# Altium footprint library hphonglib.PcbLib: 1250 footprints (part 23 of 79)
Each footprint in its own frame and in the unit in brackets; x right, y up, seen from the top. Pads: shape width x height; smd on the part's side, far side on the other; paste and mask are expansions set on the pad; w line width, h text height; cw(c..) or ccw(c..) is an arc to the next point about the centre after c.
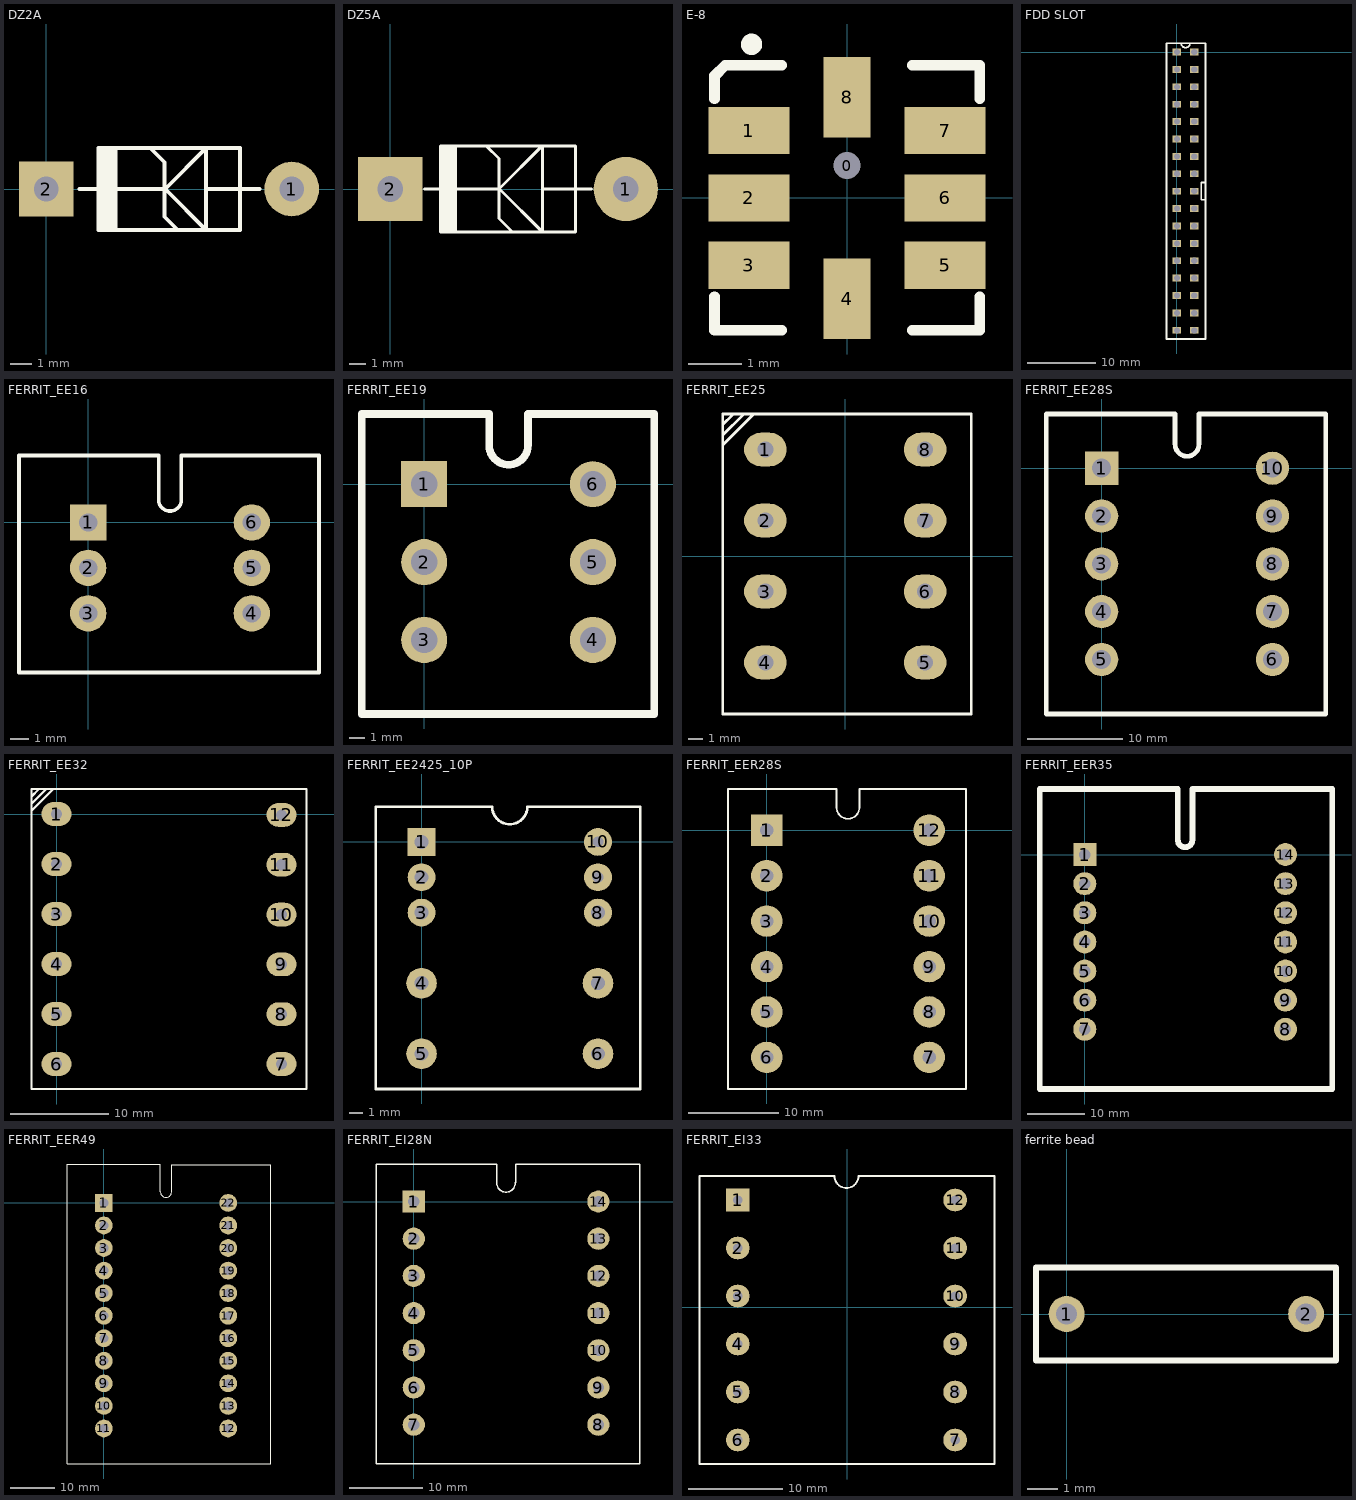
[diagram p22: the footprints below, top view; thin cyan lines are the x and y axes]

## DZ2A [mil] "Diode 2A, W 150mil, L 450mil"
height 100
pads (2):
  round 100 hole 45: 1(450,0)
  rect 100x100 hole 45: 2(0,0)
Top Overlay:
  region: 95,75 95,-75 130,-75 130,75
  lines w7: 61,0 96,0 ; 96,-31 96,0 ; 96,32 96,0 ; 115,0 215,0 ; 194,72 217,49 217,-51 239,-73 ; 218,1 218,0 ; 295,0 360,0 ; 355,0 391,0 ; 218,0 293,-75 293,75 218,0 ; 96,-75 355,-75 355,75 96,75 96,-75
3D body "SW3DPS-DIODE0_4-DEFAULT.STEP": height 100.5, standoff -100, extent -5,-46 425,55

## DZ5A [mil] "Diode 5A, W 200mil, L 550mil"
height 150
pads (2):
  round 150 hole 60: 1(550,0)
  rect 150x150 hole 60: 2(0,0)
Top Overlay:
  region: 115,100 115,-100 155,-100 155,100
  lines w7: 80,0 118,0 ; 118,-44 118,0 ; 118,46 118,0 ; 150,0 255,0 355,-100 355,100 354,100 254,0 ; 225,100 254,71 ; 254,-5 254,6 ; 254,70 254,-69 283,-98 ; 355,0 435,0 ; 432,0 470,0 ; 118,-100 118,100 432,100 432,-100 118,-100

## E-8 [mil]
pads (9):
  round 15 hole 20 unplated: 0(-0.02,23.98)
  rect 60x35 smd: 1(-72.85,49.98) 2(-72.85,-0.02) 3(-72.85,-50.02) 5(72.82,-50.02) 6(72.82,-0.02) 7(72.82,49.98)
  rect 35x60 smd: 4(-0.02,-74.82) 8(-0.02,74.79)
Top Overlay:
  circle w7.87: c-70.89,114.16 r3.94
  lines w7.87: -98.44,-73.44 -98.44,-98.44 -48.44,-98.44 ; -98.44,73.56 -98.44,90.69 ; -90.57,98.56 -48.44,98.56 ; 48.56,-98.44 98.56,-98.44 98.56,-73.44 ; 48.56,98.56 98.56,98.56 98.56,73.56
  lines w8: -98.44,90.69 -90.57,98.56
3D body: height 80, standoff 0, extent -95,-95 95,95

## FDD SLOT [mm] "Khe cam cap o dia mem"
pads (34):
  rect 1.27x1 hole 0.889: 1(0,0) 2(0,-2.54) 3(0,-5.08) 4(0,-7.62) 5(0,-10.16) 6(0,-12.7) 7(0,-15.24) 8(0,-17.78) 9(0,-20.32) 10(0,-22.86) 11(0,-25.4) 12(0,-27.94) 13(0,-30.48) 14(0,-33.02) 15(0,-35.56) 16(0,-38.1) 17(0,-40.64) 18(2.54,-40.64) 19(2.54,-38.1) 20(2.54,-35.56) 21(2.54,-33.02) 22(2.54,-30.48) 23(2.54,-27.94) 24(2.54,-25.4) 25(2.54,-22.86) 26(2.54,-20.32) 27(2.54,-17.78) 28(2.54,-15.24) 29(2.54,-12.7) 30(2.54,-10.16) 31(2.54,-7.62) 32(2.54,-5.08) 33(2.54,-2.54) 34(2.54,0)
Top Overlay:
  lines w0.254: 4.191,-21.59 3.556,-21.59 3.556,-19.05 4.191,-19.05 ; -1.524,-41.91 4.191,-41.91 4.191,1.27 1.524,1.27 0.635,1.27 ccw(c1.27,1.27) 1.905,1.27 1.016,1.27 -1.524,1.27 -1.524,-41.91

## FERRIT_EE16 [mm]
pads (6):
  rect 2x2 hole 1: 1(0,0)
  round 2 hole 1: 2(0,-2.5) 3(0,-5) 4(9,-5) 5(9,-2.5) 6(9,0)
Top Overlay:
  lines w0.2: -3.81,-8.255 -3.81,3.683 3.875,3.683 3.875,1.25 ccw(c4.5,1.25) 5.125,1.25 5.125,3.683 12.7,3.683 12.7,-8.255 -3.81,-8.255

## FERRIT_EE19 [mm] "EE19 ferrit core"
pads (6):
  rect 3x3 hole 1.7: 1(0,0)
  round 3 hole 1.7: 2(0,-5.08) 3(0,-10.16) 4(11,-10.16) 5(11,-5.08) 6(11,0)
Top Overlay:
  lines w0.5: -4.064,-14.986 -4.064,4.572 4.23,4.572 4.23,2.54 ccw(c5.5,2.54) 6.77,2.54 6.77,4.572 14.986,4.572 14.986,-14.986 -4.064,-14.986

## FERRIT_EE25 [mil] "EE25"
pads (8):
  oval 120x95 hole 45: 1(-225,300) 2(-225,100) 3(-225,-100) 4(-225,-300) 5(225,-300) 6(225,-100) 7(225,100) 8(225,300)
Top Overlay:
  lines w8: -345,313 -259,399 ; -345,339 -345,341 -287,399 ; -345,368 -345,370 -316,399 ; -345,-445 -345,400 355,400 355,-445 -345,-445

## FERRIT_EE28S [mm]
pads (10):
  rect 3.5x3.5 hole 2: 1(0,0)
  round 3.5 hole 2: 2(0,-5.04) 3(0,-10.08) 4(0,-15.12) 5(0,-20.16) 6(18,-20.16) 7(18,-15.12) 8(18,-10.08) 9(18,-5.04) 10(18,0)
Top Overlay:
  lines w0.5: -5.842,-25.908 23.622,-25.908 23.622,5.715 10.26,5.715 10.26,2.52 cw(c9,2.52) 7.74,2.52 7.74,5.715 -5.842,5.715 -5.842,-25.908

## FERRIT_EE32 [mil] "EE32"
pads (12):
  oval 120x95 hole 45: 1(0,0) 2(0,-200) 3(0,-400) 4(0,-600) 5(0,-800) 6(0,-1000) 7(900,-1000) 8(900,-800.71) 9(900,-601.43) 10(900,-402.14) 11(900,-202.86) 12(900,-3.57)
Top Overlay:
  lines w8: -100,13 -14,99 ; -100,39 -100,41 -42,99 ; -100,68 -100,70 -71,99 ; -100,-1100 1000,-1100 1000,100 -100,100 -100,-1100

## FERRIT_EE2425_10P [mm]
pads (10):
  rect 2x2 hole 1: 1(0,0)
  round 2 hole 1: 2(0,-2.54) 3(0,-5.08) 8(12.7,-5.08)
  round 2.2 / inner oval 2.2x1.2 / far side round 2.2 hole 1: 4(0,-10.16) 5(0,-15.24) 6(12.7,-15.24) 7(12.7,-10.16)
  round 2 hole 0.762: 9(12.7,-2.54) 10(12.7,0)
Top Overlay:
  lines w0.2: -3.302,-17.78 -3.302,2.54 5.08,2.54 ccw(c6.35,2.54) 7.62,2.54 15.748,2.54 15.748,-17.78 -3.302,-17.78

## FERRIT_EER28S [mm] "Stand EER core"
pads (12):
  rect 3.5x3.5 hole 1.5: 1(0,0)
  round 3.5 hole 1.5: 2(0,-5.04) 3(0,-10.08) 4(0,-15.12) 5(0,-20.16) 6(0,-25.2) 7(18,-25.2) 8(18,-20.16) 9(18,-15.12) 10(18,-10.08) 11(18,-5.04) 12(18,0)
Top Overlay:
  lines w0.2: -4.318,-28.702 22.098,-28.702 22.098,4.572 10.26,4.572 10.26,2.52 cw(c9,2.52) 7.74,2.52 7.74,4.572 -4.318,4.572 -4.318,-28.702

## FERRIT_EER35 [mm]
pads (14):
  rect 4x4 hole 2: 1(0,0)
  round 4 hole 2: 2(0,-5.08) 3(0,-10.16) 4(0,-15.24) 5(0,-20.32) 6(0,-25.4) 7(0,-30.48) 8(35,-30.48) 9(35,-25.4) 10(35,-20.32) 11(35,-15.24) 12(35,-10.16) 13(35,-5.08) 14(35,0)
Top Overlay:
  lines w1: -7.874,-40.894 43.18,-40.894 43.18,11.43 18.77,11.43 18.77,2.54 cw(c17.5,2.54) 16.23,2.54 16.23,11.43 -7.874,11.43 -7.874,-40.894
3D body "SW3dPS-power_transformer.STEP": height 33.94, standoff -2.5, extent -3.986,-32.639 40.054,7.366

## FERRIT_EER49 [mm]
pads (22):
  rect 4x4 hole 2: 1(0,0)
  round 4 hole 2: 2(0,-5.08) 3(0,-10.16) 4(0,-15.24) 5(0,-20.32) 6(0,-25.4) 7(0,-30.48) 8(0,-35.56) 9(0,-40.64) 10(0,-45.72) 11(0,-50.8) 12(28,-50.8) 13(28,-45.72) 14(28,-40.64) 15(28,-35.56) 16(28,-30.48) 17(28,-25.4) 18(28,-20.32) 19(28,-15.24) 20(28,-10.16) 21(28,-5.08) 22(28,0)
Top Overlay:
  lines w0.2: -8.255,-58.801 -8.255,8.763 12.73,8.763 12.73,2.54 ccw(c14,2.54) 15.27,2.54 15.27,8.636 37.592,8.636 37.592,-58.801 -8.255,-58.801

## FERRIT_EI28N [mm]
pads (14):
  rect 3x3 hole 1.5: 1(0,0)
  round 3 hole 1.5: 2(0,-5.04) 3(0,-10.08) 4(0,-15.12) 5(0,-20.16) 6(0,-25.2) 7(0,-30.24) 8(25,-30.24) 9(25,-25.2) 10(25,-20.16) 11(25,-15.12) 12(25,-10.08) 13(25,-5.04) 14(25,0)
Top Overlay:
  lines w0.2: -5.08,-35.56 30.607,-35.56 30.607,5.08 13.843,5.08 13.843,2.603 13.76,2.52 cw(c12.5,2.52) 11.24,2.52 11.24,5.08 -5.08,5.08 -5.08,-35.56

## FERRIT_EI33 [mm] "EI33 ferrit core"
pads (12):
  rect 2.5x2.4 / inner rect 2.5x1.2 / far side rect 2.5x2.4 hole 1: 1(-11.582,11.328)
  oval 2.5x2.4 / inner oval 2.5x1.2 / far side oval 2.5x2.4 hole 1: 2(-11.582,6.248) 3(-11.582,1.168) 4(-11.582,-3.912) 5(-11.582,-8.992) 6(-11.582,-14.072) 7(11.418,-14.072) 8(11.418,-8.992) 9(11.418,-3.912) 10(11.418,1.168) 11(11.418,6.248) 12(11.418,11.328)
Top Overlay:
  lines w0.2: -15.646,-16.612 -15.646,13.868 -1.352,13.868 ccw(c-0.082,13.868) 1.188,13.868 15.596,13.868 15.596,-16.612 -15.646,-16.612
3D body "User Library-THORNTON-NEE-40-17-12.step": height 25.5, standoff -4, extent -16.797,-20.377 17.203,20.123

## ferrite bead [mm] "Res 8mm*2mm"
pads (2):
  round 1.2 hole 0.7: 1(0,0) 2(8,0)
Top Overlay:
  lines w0.2: -1.025,-1.55 -1.025,1.55 9,1.55 9,-1.55 -1.025,-1.55
Bottom Overlay:
  lines w0.254: -1.025,-1.55 8.975,-1.55 8.975,1.55 -1.025,1.55 -1.025,-1.55
3D body: height 2.3, standoff 1.7, extent 0.1,-0.3 1.6,0.299
3D body: height 2.3, standoff 1.7, extent 6.6,-0.3 8.1,0.299
3D body: height 2.1, standoff -1, extent 7.701,-0.3 8.299,0.299
3D body: height 2.1, standoff -1, extent -0.299,-0.3 0.299,0.299
3D body: height 3.29, standoff 0.7, extent 1.59,-1.272 6.59,1.322